# Altium footprint library projects.PcbLib: 23 footprints (part 1 of 2)
Each footprint in its own frame and in the unit in brackets; x right, y up, seen from the top. Pads: shape width x height; smd on the part's side, far side on the other; paste and mask are expansions set on the pad; w line width, h text height; cw(c..) or ccw(c..) is an arc to the next point about the centre after c.
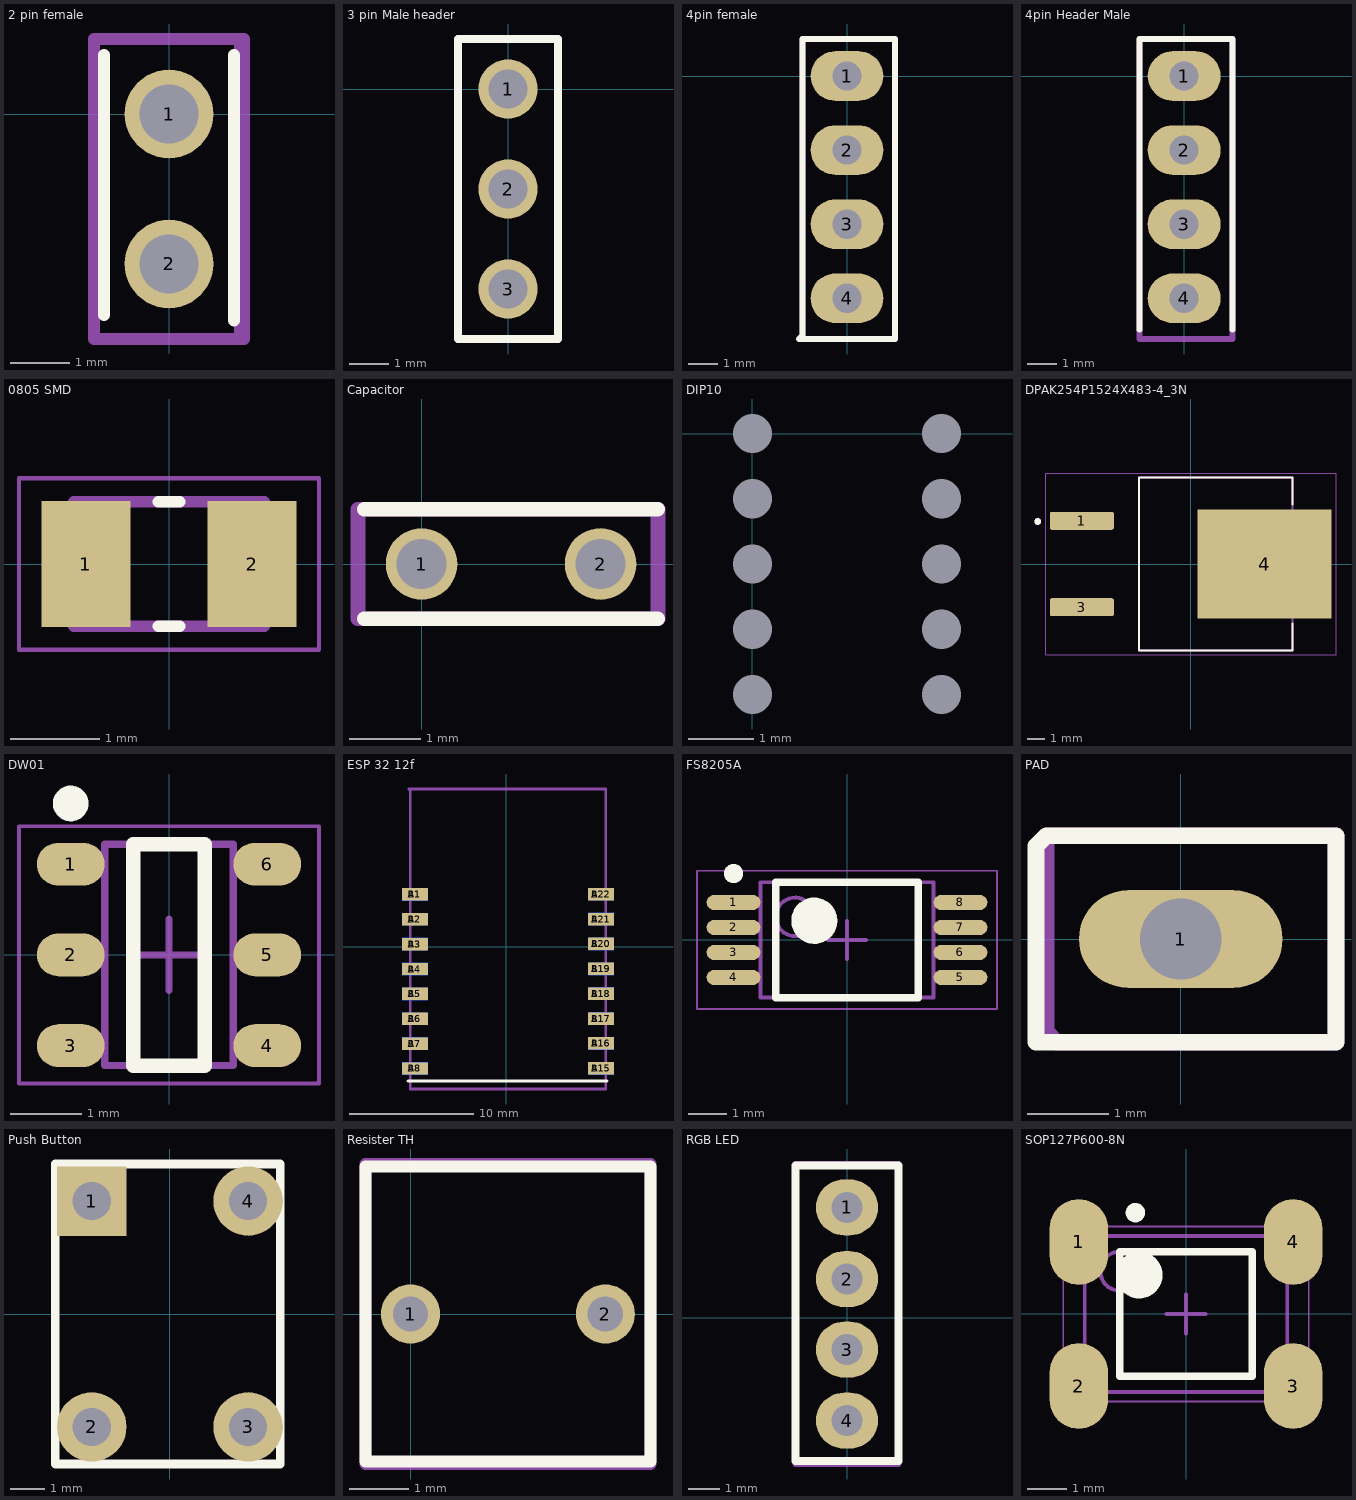
[diagram p0: the footprints below, top view; thin cyan lines are the x and y axes]

## 2 pin female [mm]
pads (2):
  round 1.5 hole 1: 1(0,0) 2(0,-2.54)
Top Overlay:
  lines w0.203: -1.1,-3.4 -1.1,1 ; 1.1,-3.5 1.1,1
Mechanical 13:
  lines w0.203: -1.27,-3.81 1.27,-3.81 1.27,1.27 -1.27,1.27 -1.27,-3.81
Mechanical 15:
  lines w0.203: -1.27,-3.81 1.2,-3.81 1.2,1.27 -1.27,1.27 -1.27,-3.81
Mechanical 29:
  text ".Designator" at -3.302,-2.54 h1.52

## 3 pin Male header [mm]
pads (3):
  round 1.5 hole 1: 1(0,0) 2(0,-2.54) 3(0,-5.08)
Top Overlay:
  lines w0.203: -1.27,-6.35 1.27,-6.35 1.27,1.27 -1.27,1.27 -1.27,-6.35
Mechanical 13:
  lines w0.203: -1.27,-6.35 1.27,-6.35 1.27,1.27 -1.27,1.27 -1.27,-6.35
Mechanical 15:
  lines w0.203: -1.27,-6.35 1.27,-6.35 1.27,1.27 -1.27,1.27 -1.27,-6.35
Mechanical 29:
  text ".Designator" at -3.302,-2.54 h1.52
3D body "M20-9990345_asm.stp": height 8.65, standoff -3.03, extent -1.27,-6.35 1.27,1.27

## 4pin female [mm]
pads (4):
  oval 2.5x1.7 hole 1: 1(0,0) 2(0,-2.54) 3(0,-5.08) 4(0,-7.62)
Top Overlay:
  lines w0.203: -1.651,-9.017 1.651,-9.017 1.651,1.27 -1.524,1.27 -1.524,-8.89 -1.651,-9.017
Mechanical 13:
  lines w0.203: -1.524,-9.017 1.651,-9.017 1.651,1.27 1.397,1.27 -0.254,1.27 -1.524,1.27 -1.524,-9.017
Mechanical 29:
  text ".Designator" at -1.219,-3.802 h0.25
3D body "PPPC041LFBN-RC.STEP": height 8.52, standoff -3.19, extent -1.27,-9.234 1.27,1.434

## 4pin Header Male [mm]
pads (4):
  oval 2.5x1.7 hole 1: 1(0,0) 2(0,-2.54) 3(0,-5.08) 4(0,-7.62)
Top Overlay:
  lines w0.203: -1.524,-8.7 -1.524,1.27 1.651,1.27 1.651,-8.7
Mechanical 13:
  lines w0.203: -1.524,-9.017 1.651,-9.017 1.651,1.27 1.397,1.27 -0.254,1.27 -1.524,1.27 -1.524,-9.017
Mechanical 29:
  text ".Designator" at -1.219,-3.802 h0.25
3D body "10129379-904002BLF.STEP": height 2.42, standoff -2.28, extent -9.839,-8.89 0.381,1.27

## 0805 SMD [mm]
pads (2):
  rect 1x1.42 smd: 1(-0.935,0) 2(0.935,0)
Top Overlay:
  lines w0.127: -0.12,-0.7 0.12,-0.7 ; -0.12,0.7 0.12,0.7
Mechanical 13:
  lines w0.127: -1.07,-0.7 1.07,-0.7 1.07,0.7 -1.07,0.7 -1.07,-0.7
  text ".Designator" at -1.346,-0.119 h0.25
Mechanical 15:
  lines w0.05: -1.685,-0.962 1.685,-0.962 1.685,0.962 -1.685,0.962 -1.685,-0.962
3D body "RES_CRGCQ0805F1K2_TEC.step": height 0.66, standoff 0, extent -1.075,-0.698 1.075,0.698

## Capacitor [mm]
pads (2):
  round 1 hole 0.7: 1(0,0) 2(2.5,0)
Top Overlay:
  lines w0.203: -0.8,-0.762 3.3,-0.762 ; -0.8,0.762 3.3,0.762
Mechanical 29:
  lines w0.203: -0.889,-0.762 3.302,-0.762 3.302,0.762 -0.889,0.762 -0.889,-0.762
  text ".Designator" at -0.635,-0.085 h0.51
3D body "K104K15X7RF5TL2_VIS.step": height 4.29, standoff -3.91, extent -0.769,-1.295 3.218,1.295

## DIP10 [mm]
pads (10):
  rect 0x0 hole 0.6: 1(0,0)
  round 0 hole 0.6: 2(0,-1) 3(0,-2) 4(0,-3) 5(0,-4) 6(2.9,-4) 7(2.9,-3) 8(2.9,-2) 9(2.9,-1) 10(2.9,0)

## DPAK254P1524X483-4_3N [mm]
height 4.83
pads (3):
  rrect25% 3.78x1.06 smd: 1(-6.4,2.54) 3(-6.4,-2.54)
  rect 7.88x6.39 smd paste-5: 4(4.35,0)
Top Overlay:
  circle w0.2: c-9,2.5 r0.1
  lines w0.127: 5.973,-3.515 5.973,-5.08 -3.043,-5.08 -3.043,5.08 5.973,5.08 5.973,3.515
Top Paste:
  region: 4.025,0.645 2.705,0.645 2.705,2.545 4.025,2.545
  region: 5.995,0.645 4.675,0.645 4.675,2.545 5.995,2.545
  region: 7.965,0.645 6.645,0.645 6.645,2.545 7.965,2.545
  region: 2.055,0.645 0.735,0.645 0.735,2.545 2.055,2.545
  region: 2.055,-2.545 0.735,-2.545 0.735,-0.645 2.055,-0.645
  region: 4.025,-2.545 2.705,-2.545 2.705,-0.645 4.025,-0.645
  region: 5.995,-2.545 4.675,-2.545 4.675,-0.645 5.995,-0.645
  region: 7.965,-2.545 6.645,-2.545 6.645,-0.645 7.965,-0.645
Mechanical 13:
  circle w0.2: c-9,2.5 r0.1
  lines w0.127: -3.043,-5.08 5.973,-5.08 5.973,5.08 -3.043,5.08 -3.043,-5.08
Mechanical 15:
  lines w0.05: -8.54,-5.33 -8.54,5.33 8.54,5.33 8.54,-5.33 -8.54,-5.33
3D body "step_temp.STEP": height 4.83, standoff -0.25, extent -7.62,-5.08 7.62,5.08

## DW01 [mm] "SOIC, 6-Leads, Body 2.90x1.60mm, Pitch 1.27mm, IPC Medium Density"
height 1.45
pads (6):
  oval 0.95x0.6 smd: 1(-1.375,1.27) 2(-1.375,0) 3(-1.375,-1.27) 4(1.375,-1.27) 5(1.375,0) 6(1.375,1.27)
Top Overlay:
  circle w0.25: c-1.375,2.12 r0.125
  lines w0.2: -0.5,-1.55 -0.5,1.55 0.5,1.55 0.5,-1.55 -0.5,-1.55
Mechanical 13:
  lines w0.1: -0.9,-1.55 -0.9,1.55 0.9,1.55 0.9,-1.55 -0.9,-1.55
Mechanical 15:
  lines w0.05: -2.1,-1.8 -2.1,1.8 2.1,1.8 2.1,-1.8 -2.1,-1.8
  lines w0.1: -0.5,0 0.5,0 ; 0,-0.5 0,0.5
3D body: height 1.45, standoff 0.15, extent -0.9,-1.55 0.9,1.55

## ESP 32 12f [mm]
pads (32):
  rect 2.1x1 smd: A1(-7.366,4.221) A2(-7.366,2.221) A3(-7.366,0.221) A4(-7.366,-1.779) A5(-7.366,-3.779) A6(-7.366,-5.779) A7(-7.366,-7.779) A8(-7.366,-9.779) A15(7.62,-9.764) A16(7.62,-7.764) A17(7.62,-5.764) A18(7.62,-3.764) A19(7.62,-1.764) A20(7.62,0.236) A21(7.62,2.236) A22(7.62,4.236)
  rect 2x1 smd far side: B1(-7.366,4.221) B2(-7.366,2.221) B3(-7.366,0.221) B4(-7.366,-1.779) B5(-7.366,-3.779) B6(-7.366,-5.779) B7(-7.366,-7.779) B8(-7.366,-9.779) B15(7.62,-9.764) B16(7.62,-7.764) B17(7.62,-5.764) B18(7.62,-3.764) B19(7.62,-1.764) B20(7.62,0.236) B21(7.62,2.236) B22(7.62,4.236)
Top Overlay:
  lines w0.254: -7.9,-10.8 8.102,-10.8
Mechanical 13:
  lines w0.203: -7.874,12.7 8.001,12.7 8.001,-11.43 -7.747,-11.43 -7.747,12.573 -7.874,12.7
Mechanical 29:
  text ".Designator" at -1.473,1.532 h0.25
3D body "ESP-12F--3DModel-STEP-305423.STEP": height 3.15, standoff -0.02, extent -7.746,-11.365 8.254,12.635

## FS8205A [mm] "TSOP, 8-Leads, Body 2.93x4.40mm, Pitch 0.65mm, IPC Medium Density"
height 1.2
pads (8):
  oval 1.4x0.4 smd mask+0.07: 1(-2.95,0.975) 2(-2.95,0.325) 3(-2.95,-0.325) 4(-2.95,-0.975) 5(2.95,-0.975) 6(2.95,-0.325) 7(2.95,0.325) 8(2.95,0.975)
Top Overlay:
  circle w0.25: c-2.95,1.725 r0.125
  circle w0.6: c-0.85,0.5 r0.3
  lines w0.2: -1.85,-1.5 -1.85,1.5 1.85,1.5 1.85,-1.5 -1.85,-1.5
Mechanical 13:
  circle w0.1: c-1.35,0.6 r0.5
  lines w0.1: -2.25,-1.5 -2.25,1.5 2.25,1.5 2.25,-1.5 -2.25,-1.5
  text ".Designator" at -0.838,-0.246 h0.25
Mechanical 15:
  lines w0.05: -3.9,-1.8 -3.9,1.8 3.9,1.8 3.9,-1.8 -3.9,-1.8
  lines w0.1: -0.5,0 0.5,0 ; 0,-0.5 0,0.5
3D body: height 1.2, standoff 0.15, extent -2.25,-1.5 2.25,1.5

## PAD [mm]
pads (1):
  oval 2.5x1.2 hole 1: 1(0,0)
Top Overlay:
  lines w0.203: -1.778,-1.27 -1.778,1.143 -1.651,1.27 1.905,1.27 1.905,-1.27 -1.778,-1.27
Mechanical 13:
  lines w0.203: -1.651,-1.143 -1.651,1.27 -1.143,1.27 1.905,1.27 1.905,-0.889 1.905,-1.27 -1.524,-1.27 -1.651,-1.143
Mechanical 29:
  text ".Designator" at -1.092,0.897 h0.25

## Push Button [mm]
pads (4):
  rect 2x2 hole 1.1: 1(-2.25,3.25)
  round 2 hole 1.1: 2(-2.25,-3.25) 3(2.25,-3.25) 4(2.25,3.25)
Top Overlay:
  lines w0.254: -3.302,-4.318 3.175,-4.318 3.175,4.318 -3.302,4.318 -3.302,-4.318
Mechanical 1:
  circle w0.762: c-2.413,3.175 r0.127
Mechanical 13:
  circle w0.762: c-2.286,3.556 r0.284
  lines w0.203: -3.302,-4.318 3.175,-4.318 3.175,4.318 -3.302,4.318 -3.302,-4.318
Mechanical 29:
  text ".Designator" at -1.219,0.135 h0.25
3D body "1825910-6.STEP": height 5.02, standoff -3.5, extent -3.048,-4.026 2.942,3.772

## Resister TH [mm]
pads (2):
  round 1 hole 0.6: 1(0,0) 2(3.3,0)
Top Overlay:
  lines w0.2: 4.064,-2.5 -0.762,-2.5 -0.762,2.5 4.064,2.5
  lines w0.203: 4.064,-2.5 4.064,2.5
Mechanical 29:
  lines w0.203: -0.762,-2.54 -0.762,2.54 4.064,2.54 4.064,-2.54 -0.762,-2.54
  text ".Designator" at -0.762,-0.085 h0.51
3D body "STA_CFM14_STP.step": height 2.54, standoff -2.26, extent -2.426,-0.889 5.982,1.103

## RGB LED [mm]
pads (4):
  oval 2x1.8 hole 1: 1(0,3.556) 2(0,1.25) 3(0,-1.016) 4(0,-3.302)
Top Overlay:
  lines w0.254: -1.651,-4.6 -1.651,4.9 1.651,4.9 1.651,-4.6 -1.651,-4.6
Mechanical 13:
  lines w0.203: -1.651,-4.699 -1.651,4.953 1.651,4.953 1.651,-4.699 -1.651,-4.699
Mechanical 29:
  text ".Designator" at -1.219,0.262 h0.25

## SOP127P600-8N [mm]
height 1.1
pads (4):
  oval 1.5x2.2 smd: 1(-2.75,1.85) 2(-2.75,-1.85) 3(2.75,-1.85) 4(2.75,1.85)
Top Overlay:
  circle w0.6: c-1.2,1 r0.3
  circle w0.25: c-1.3,2.6 r0.125
  lines w0.2: -1.7,-1.6 1.7,-1.6 1.7,1.6 -1.7,1.6 -1.7,-1.6
Mechanical 13:
  circle w0.1: c-1.7,1.1 r0.5
  lines w0.1: -2.6,-2 2.6,-2 2.6,2 -2.6,2 -2.6,-2
Mechanical 15:
  lines w0.05: -3.15,-2.25 3.15,-2.25 3.15,2.25 -3.15,2.25 -3.15,-2.25
  lines w0.1: -0.5,0 0.5,0 ; 0,-0.5 0,0.5
3D body: height 1.1, standoff 0.15, extent -2.6,-2 2.6,2